# Altium footprint library PROC051C_PCB.PcbLib: 118 footprints (part 4 of 8)
Each footprint in its own frame and in the unit in brackets; x right, y up, seen from the top. Pads: shape width x height; smd on the part's side, far side on the other; paste and mask are expansions set on the pad; w line width, h text height; cw(c..) or ccw(c..) is an arc to the next point about the centre after c.
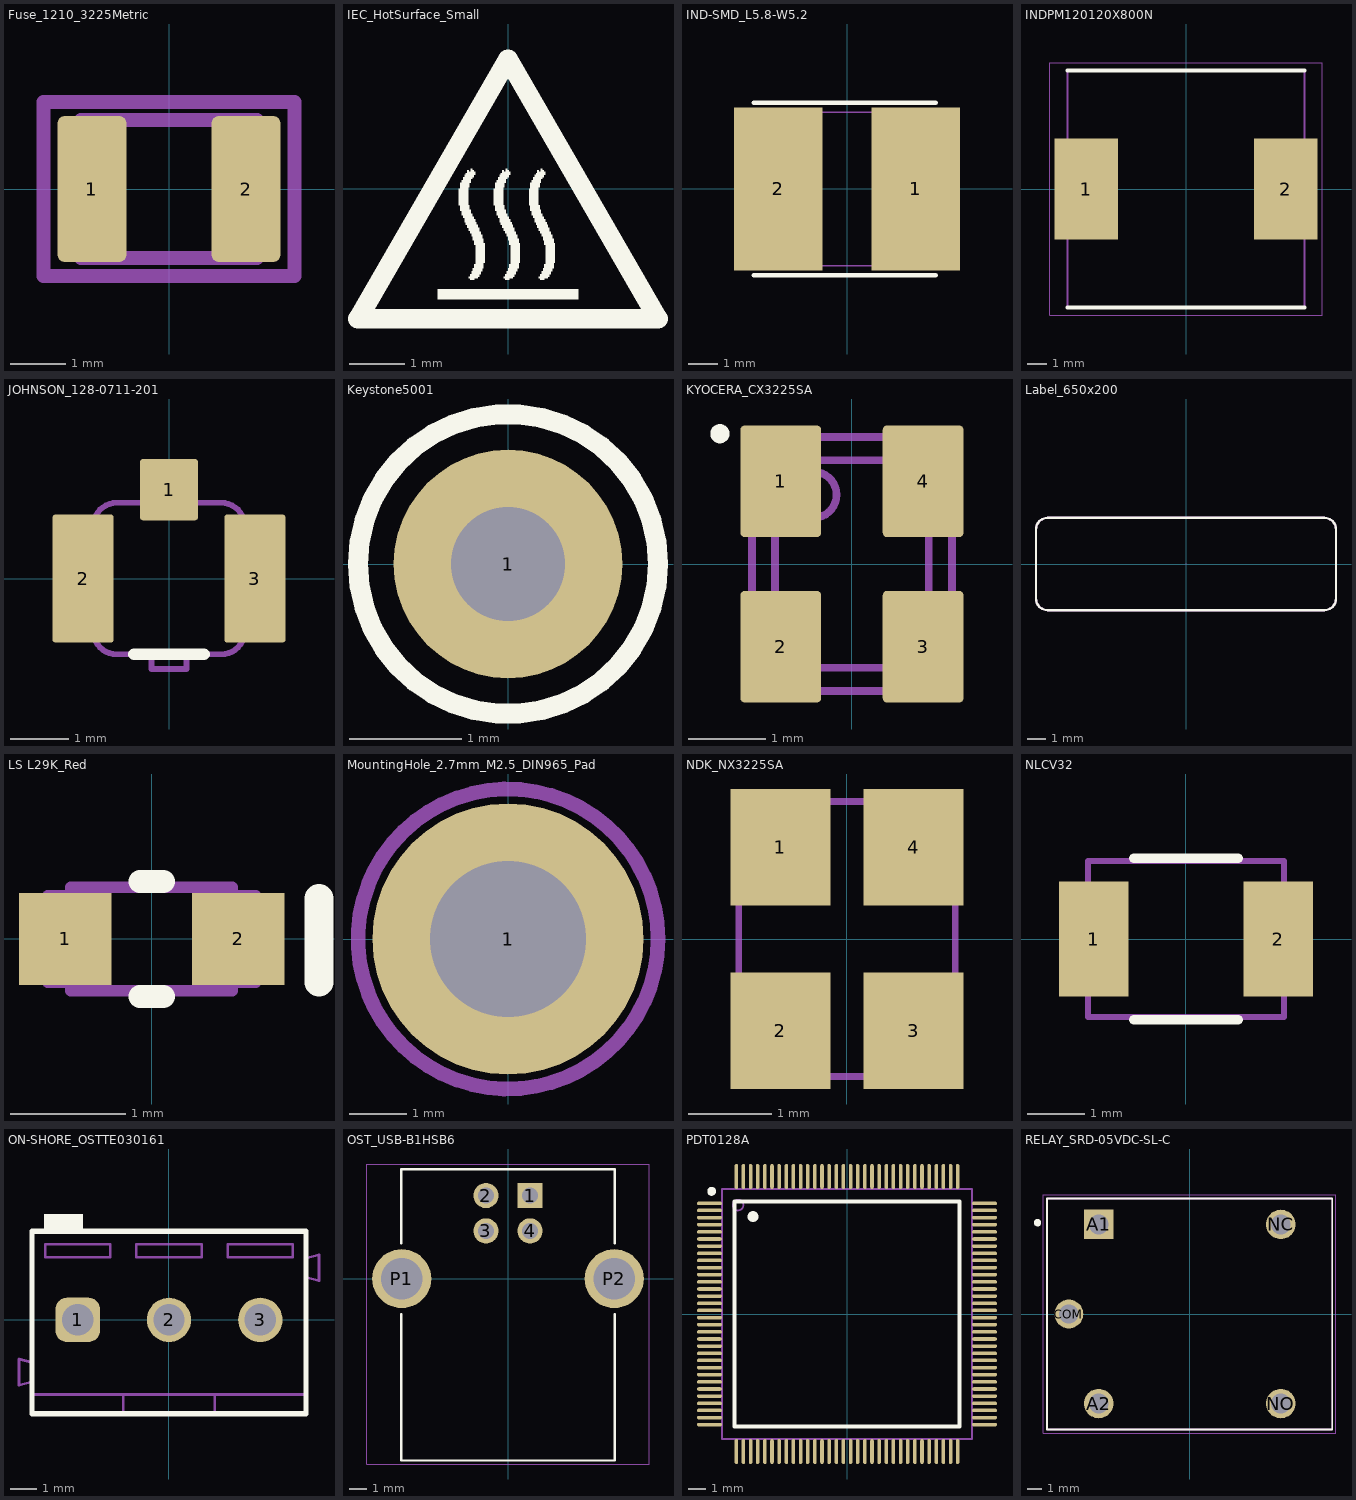
[diagram p3: the footprints below, top view; thin cyan lines are the x and y axes]

## Fuse_1210_3225Metric [mm]
pads (2):
  rrect20% 1.25x2.65 smd: 1(-1.4,0) 2(1.4,0)
Mid-Layer 26:
  lines w0.254: -0.602,-1.36 0.602,-1.36 ; -0.602,1.36 0.602,1.36
Mechanical 4:
  lines w0.254: -2.28,-1.58 2.28,-1.58 2.28,1.58 -2.28,1.58 -2.28,-1.58
Mechanical 6:
  lines w0.254: -1.6,-1.25 1.6,-1.25 1.6,1.25 -1.6,1.25 -1.6,-1.25
  text "'.Designator'" at -1.15,-0.319 h0.8

## IEC_HotSurface_Small [mm]
Top Overlay:
  drawing of 10 lines, arcs and shapes, not listed

## IND-SMD_L5.8-W5.2 [mm]
pads (2):
  rect 3x5.5 smd paste-100 mask+0.05: 1(2.325,0) 2(-2.325,0)
Top Overlay:
  lines w0.152: -3.15,-2.921 3.002,-2.921 ; -3.15,2.921 3.002,2.921
Top Paste:
  region: -2.947,-2.6 -2.947,2.6 -0.747,2.6 -0.747,-2.6
  region: 2.998,2.6 2.998,-2.6 0.798,-2.6 0.798,2.6
Mechanical 15:
  region: 2.985,-2.6 2.985,-2.625 2.95,-2.66 2.9,-2.66 2.865,-2.625 2.865,-2.6 2.865,-2.575 2.9,-2.54 2.95,-2.54 2.985,-2.575 2.985,-2.6
  region: 0.925,2.6 1.525,2.6 2.025,2.2 2.425,1.7 2.825,0.9 2.925,0 2.825,-0.9 2.425,-1.7 2.125,-2.1 1.525,-2.6 0.925,-2.6
  region: -0.875,-2.6 -1.475,-2.6 -1.975,-2.2 -2.375,-1.7 -2.775,-0.9 -2.875,0 -2.775,0.9 -2.375,1.7 -2.075,2.1 -1.475,2.6 -0.875,2.6
  lines w0.051: -2.875,0 -2.775,-0.9 -2.375,-1.7 -1.975,-2.2 -1.475,-2.6 1.525,-2.6 2.025,-2.2 2.425,-1.7 2.825,-0.9 2.925,0 2.825,0.9 2.425,1.7 2.025,2.2 1.525,2.6 -1.475,2.6 -2.075,2.1 -2.375,1.7 -2.775,0.9 -2.875,0

## INDPM120120X800N [mm]
pads (2):
  rect 3.2x5.1 smd: 1(-5.05,0) 2(5.05,0)
Top Overlay:
  lines w0.2: -6,-6 6,-6 ; -6,6 6,6
Mechanical 13:
  lines w0.05: -6.9,-6.4 -6.9,6.4 6.9,6.4 6.9,-6.4 -6.9,-6.4
  lines w0.1: -6,-6 -6,6 6,6 6,-6 -6,-6
3D body "CDRH127_LDNP-221MC.STEP": height 8, standoff 0, extent -6,-6 6,6

## JOHNSON_128-0711-201 [mm] "UMC Straight Jack Receptacle, 50 Ohm, SMT"
height 1.25
pads (3):
  rrect10% 1x1.05 smd: 1(0,1.525)
  rrect10% 1.05x2.2 smd: 2(-1.475,0) 3(1.475,0)
Top Overlay:
  lines w0.2: -0.6,-1.3 0.6,-1.3
Mechanical 5:
  lines w0.1: -0.3,1.3 -0.3,1.55 0.3,1.55 0.3,1.3 ; -1.3,-0.9 ccw(c-0.9,-0.9) -0.9,-1.3 -0.3,-1.3 -0.3,-1.55 0.3,-1.55 0.3,-1.3 0.9,-1.3 ccw(c0.9,-0.9) 1.3,-0.9 ; -1.3,-0.9 -1.5,-0.9 -1.5,0.9 -1.3,0.9 ; -1.3,-0.9 -1.3,0.9 ; -1.3,0.9 cw(c-0.9,0.9) -0.9,1.3 0.9,1.3 cw(c0.9,0.9) 1.3,0.9 ; 1.3,-0.9 1.5,-0.9 1.5,0.9 1.3,0.9 ; 1.3,-0.9 1.3,0.9
  text ".Designator" at -0.297,-0.247 h0.8
3D body "128-0711-201.stp": height 1.25, standoff 0, extent -1.5,-1.55 1.5,1.55

## Keystone5001 [mil] "For Keystone 500x miniature loop terminals"
height 181.1
pads (1):
  round 80 hole 40: 1(0,0)
Top Overlay:
  circle w7: c0,0 r52.5
Mechanical 5:
  circle w3.94: c0,0 r52.5
  text ".Designator" at -92.97,-15 h18
3D body "Keystone_5001.stp": height 181.97, standoff -118.11, extent -49,-49 49.04,49.24

## KYOCERA_CX3225SA [mm] "SMD, 4-Leads, Body 3.2x2.5mm"
height 0.9
pads (4):
  rrect10% 1.05x1.45 smd: 1(-0.925,1.075) 2(-0.925,-1.075) 3(0.925,-1.075) 4(0.925,1.075)
Top Overlay:
  circle w0.125: c-1.717,1.694 r0.062
Mechanical 5:
  circle w0.1: c-0.5,0.9 r0.3
  lines w0.1: -1.3,-1.35 cw(c-1.3,-1.65) -1,-1.65 1,-1.65 cw(c1.3,-1.65) 1.3,-1.35 1.3,1.35 cw(c1.3,1.65) 1,1.65 -1,1.65 cw(c-1.3,1.65) -1.3,1.35 -1.3,-1.35 ; -1,-1.05 ccw(c-0.7,-1.05) -0.7,-1.35 0.7,-1.35 ccw(c0.7,-1.05) 1,-1.05 1,1.05 ccw(c0.7,1.05) 0.7,1.35 -0.7,1.35 ccw(c-0.7,1.05) -1,1.05 -1,-1.05
  text ".Designator" at -0.475,-0.461 h0.8
3D body: height 0.9, standoff 0.4, extent -0.999,-1.349 0.999,1.349
3D body: height 0.6, standoff 0, extent -1.301,-1.651 1.301,1.651
3D body: height 0.9, standoff 0.8, extent -0.799,0.601 -0.201,1.199

## Label_650x200 [mil] "Thermal Transfer Label"
height 1
pads (1):
  round 1 on Mech13: 0(0,0)
Top Overlay:
  lines w5: -325,-75 ccw(c-300,-75) -300,-100 300,-100 ccw(c300,-75) 325,-75 325,75 ccw(c300,75) 300,100 -300,100 ccw(c-300,75) -325,75 -325,-75
Mechanical 5:
  lines w5: -325,-75 ccw(c-300,-75) -300,-100 300,-100 ccw(c300,-75) 325,-75 325,75 ccw(c300,75) 300,100 -300,100 ccw(c-300,75) -325,75 -325,-75
  text ".Designator" at -60,-20 h40
3D body: height 1, standoff 0, extent -325.02,-100.02 325.02,100.02

## LS L29K_Red [mm] "SMD, 2-Leads, Body 1.3x0.8mm"
height 0.67
pads (2):
  rect 0.8x0.8 smd paste-0.4: 1(-0.75,0) 2(0.75,0)
Top Overlay:
  lines w0.2: -0.1,-0.5 0.1,-0.5 ; -0.1,0.5 0.1,0.5
  lines w0.25: 1.45,-0.375 1.45,0.35
Top Paste:
  rectangle: -1.1,-0.35 -0.5,0.35
  rectangle: 0.5,-0.35 1.1,0.35
Mechanical 5:
  lines w0.1: 0.7,0.375 0.9,0.375 0.9,-0.375 0.7,-0.375 ; 0.7,-0.375 0.7,0.2 ; 0.7,-0.375 0.7,-0.45 -0.7,-0.45 -0.7,-0.375 -0.9,-0.375 -0.9,0.375 -0.7,0.375 -0.7,0.45 0.7,0.45 ; 0.7,0.2 0.45,0.45 0.7,0.45 ; 0.7,0.2 0.7,0.45
  text ".Designator" at -0.75,-0.2 h0.35
3D body: height 0.18, standoff 0, extent -0.899,-0.374 -0.701,0.374
3D body: height 0.18, standoff 0, extent 0.701,-0.374 0.899,0.374
3D body: height 0.18, standoff 0, extent -0.699,-0.449 0.699,0.449
3D body: height 0.67, standoff 0.18, extent -0.699,-0.449 0.699,0.449
3D body: height 0.67, standoff 0.65, extent 0.451,0.201 0.699,0.449

## MountingHole_2.7mm_M2.5_DIN965_Pad [mm]
pads (1):
  round 4.7 hole 2.7: 1(0,0)
Mechanical 6:
  text "'.Designator'" at -1.139,-0.398 h1
Mechanical 13:
  circle w0.254: c0,0 r2.6

## NDK_NX3225SA [mm] "NDK"
height 0.6
pads (4):
  rect 1.2x1.4 smd: 1(-0.8,1.1) 2(-0.8,-1.1) 3(0.8,-1.1) 4(0.8,1.1)
Mechanical 5:
  circle w0.08: c-0.8,1.1 r0.2
  lines w0.08: -1.3,-1.65 -1.3,1.65 1.3,1.65 1.3,-1.65 -1.3,-1.65
  text ".Designator" at 0.401,-0.915 h0.7
3D body "NDK_NX3225SA.stp": height 0.7, standoff 0, extent -1.3,-1.65 1.3,1.65

## NLCV32 [mm] "TDK"
height 2.4
pads (2):
  rect 1.2x2 smd: 1(-1.6,0) 2(1.6,0)
Top Overlay:
  lines w0.17: -0.9,-1.4 0.9,-1.4 ; -0.9,1.4 0.9,1.4
Mechanical 5:
  lines w0.1: -1.7,-1.35 1.7,-1.35 1.7,1.35 -1.7,1.35 -1.7,-1.35
  text ".Designator" at -1.081,-0.386 h0.9
3D body: height 2.4, standoff 0, extent -1.699,-1.349 1.699,1.349

## ON-SHORE_OSTTE030161 [mm] "Terminal Block, 3.5mm, 3x1, TH"
height 8.5
pads (3):
  rrect50% 1.7x1.7 hole 1.2: 1(-3.5,0)
  round 1.7 hole 1.2: 2(0,0) 3(3.5,0)
Top Overlay:
  rectangle: -4.8,3.45 -3.3,4.05
  lines w0.2: -5.25,-3.6 5.25,-3.6 5.25,3.4 -5.25,3.4 -5.25,-3.6
Mechanical 5:
  lines w0.1: 5.25,1.634 5.75,1.5 5.75,2.5 5.25,2.366 ; -5.25,-2.859 -1.75,-2.859 ; -5.25,-2.859 -5.25,-3.6 -1.75,-3.6 ; -5.25,-2.859 -5.25,3.4 -1.75,3.4 1.75,3.4 5.25,3.4 5.25,-2.859 ; -1.75,-3.6 -1.75,-2.859 ; -1.75,-3.6 -1.75,-2.859 ; -1.75,-3.6 1.75,-3.6 ; -1.75,-2.859 1.75,-2.859 ; 1.75,-3.6 1.75,-2.859 ; 1.75,-3.6 1.75,-2.859 ; 1.75,-3.6 5.25,-3.6 5.25,-2.859 ; 1.75,-2.859 5.25,-2.859 ; -5.75,-2.5 -5.75,-1.5 -5.25,-1.634 -5.25,-2.366 -5.75,-2.5 ; -4.75,2.4 -2.25,2.4 -2.25,2.9 -4.75,2.9 -4.75,2.4 ; -1.25,2.4 1.25,2.4 1.25,2.9 -1.25,2.9 -1.25,2.4 ; 2.25,2.4 4.75,2.4 4.75,2.9 2.25,2.9 2.25,2.4
  text ".Designator" at -1.234,0.972 h1.85
3D body "OSTTE030161.stp": height 8.4, standoff -3.8, extent -5.75,-3.6 5.75,3.4

## OST_USB-B1HSB6 [mm]
pads (6):
  rect 1.428x1.428 / inner round 1.428 / far side rect 1.428x1.428 hole 0.92: 1(1.25,4.71)
  round 1.428 hole 0.92: 2(-1.25,4.71) 3(-1.25,2.71) 4(1.25,2.71)
  round 3.346 hole 2.33: P1(-6.02,0) P2(6.02,0)
Top Overlay:
  lines w0.127: -6.05,-2 -6.05,-10.3 6.05,-10.3 6.05,-2 ; -6.05,2 -6.05,6.2 6.05,6.2 6.05,2
Mechanical 15:
  lines w0.05: -8,-10.5 8,-10.5 8,6.5 -8,6.5 -8,-10.5
3D body "step_temp.STEP": height 10.9, standoff -3.6, extent -7.42,-10.25 7.42,6.25

## PDT0128A [mm] "Thin QFP, 128-Leads, Body 14x14mm, Pitch 0.4mm"
height 1.2
pads (128):
  oval 1.4x0.2 smd: 1(-7.7,6.2) 2(-7.7,5.8) 3(-7.7,5.4) 4(-7.7,5) 5(-7.7,4.6) 6(-7.7,4.2) 7(-7.7,3.8) 8(-7.7,3.4) 9(-7.7,3) 10(-7.7,2.6) 11(-7.7,2.2) 12(-7.7,1.8) 13(-7.7,1.4) 14(-7.7,1) 15(-7.7,0.6) 16(-7.7,0.2) 17(-7.7,-0.2) 18(-7.7,-0.6) 19(-7.7,-1) 20(-7.7,-1.4) 21(-7.7,-1.8) 22(-7.7,-2.2) 23(-7.7,-2.6) 24(-7.7,-3) 25(-7.7,-3.4) 26(-7.7,-3.8) 27(-7.7,-4.2) 28(-7.7,-4.6) 29(-7.7,-5) 30(-7.7,-5.4) 31(-7.7,-5.8) 32(-7.7,-6.2) 65(7.7,-6.2) 66(7.7,-5.8) 67(7.7,-5.4) 68(7.7,-5) 69(7.7,-4.6) 70(7.7,-4.2) 71(7.7,-3.8) 72(7.7,-3.4) 73(7.7,-3) 74(7.7,-2.6) 75(7.7,-2.2) 76(7.7,-1.8) 77(7.7,-1.4) 78(7.7,-1) 79(7.7,-0.6) 80(7.7,-0.2) 81(7.7,0.2) 82(7.7,0.6) 83(7.7,1) 84(7.7,1.4) 85(7.7,1.8) 86(7.7,2.2) 87(7.7,2.6) 88(7.7,3) 89(7.7,3.4) 90(7.7,3.8) 91(7.7,4.2) 92(7.7,4.6) 93(7.7,5) 94(7.7,5.4) 95(7.7,5.8) 96(7.7,6.2)
  oval 0.2x1.4 smd: 33(-6.2,-7.7) 34(-5.8,-7.7) 35(-5.4,-7.7) 36(-5,-7.7) 37(-4.6,-7.7) 38(-4.2,-7.7) 39(-3.8,-7.7) 40(-3.4,-7.7) 41(-3,-7.7) 42(-2.6,-7.7) 43(-2.2,-7.7) 44(-1.8,-7.7) 45(-1.4,-7.7) 46(-1,-7.7) 47(-0.6,-7.7) 48(-0.2,-7.7) 49(0.2,-7.7) 50(0.6,-7.7) 51(1,-7.7) 52(1.4,-7.7) 53(1.8,-7.7) 54(2.2,-7.7) 55(2.6,-7.7) 56(3,-7.7) 57(3.4,-7.7) 58(3.8,-7.7) 59(4.2,-7.7) 60(4.6,-7.7) 61(5,-7.7) 62(5.4,-7.7) 63(5.8,-7.7) 64(6.2,-7.7) 97(6.2,7.7) 98(5.8,7.7) 99(5.4,7.7) 100(5,7.7) 101(4.6,7.7) 102(4.2,7.7) 103(3.8,7.7) 104(3.4,7.7) 105(3,7.7) 106(2.6,7.7) 107(2.2,7.7) 108(1.8,7.7) 109(1.4,7.7) 110(1,7.7) 111(0.6,7.7) 112(0.2,7.7) 113(-0.2,7.7) 114(-0.6,7.7) 115(-1,7.7) 116(-1.4,7.7) 117(-1.8,7.7) 118(-2.2,7.7) 119(-2.6,7.7) 120(-3,7.7) 121(-3.4,7.7) 122(-3.8,7.7) 123(-4.2,7.7) 124(-4.6,7.7) 125(-5,7.7) 126(-5.4,7.7) 127(-5.8,7.7) 128(-6.2,7.7)
Top Overlay:
  circle w0.25: c-7.575,6.87 r0.125
  lines w0.2: -6.3,-6.3 6.3,-6.3 6.3,6.3 -6.3,6.3 -6.3,-6.3
  lines w0.6: -5.265,5.446 ccw(c-5.564,5.462) -5.264,5.462
Mechanical 5:
  circle w0.1: c-6.1,6.1 r0.3
  lines w0.1: -7,-7 7,-7 7,7 -7,7 -7,-7
  text ".Designator" at 1.275,-1.498 h1.02
3D body "PDT0128A.stp": height 1.07, standoff 0, extent -8,-8 8,8

## RELAY_SRD-05VDC-SL-C [mm]
pads (5):
  rect 1.98x1.98 / inner round 1.98 / far side rect 1.98x1.98 hole 1.32: A1(-6.1,6)
  round 1.98 hole 1.32: A2(-6.1,-6) NC(6.1,6) NO(6.1,-6)
  round 1.935 hole 1.29: COM(-8.1,0)
Top Overlay:
  circle w0.3: c-10.2,6.119 r0.1
  lines w0.127: -9.55,-7.75 -9.55,7.75 9.55,7.75 9.55,-7.75 -9.55,-7.75
Mechanical 13:
  lines w0.127: -9.55,-7.75 -9.55,7.75 9.55,7.75 9.55,-7.75 -9.55,-7.75
Mechanical 15:
  lines w0.05: -9.8,-8 -9.8,8 9.8,8 9.8,-8 -9.8,-8
3D body "step_temp.STEP": height 15.8, standoff -3, extent -9.6,-7.8 9.6,7.8